# Altium footprint library con-amp.PCBLIB: 295 footprints (part 16 of 19)
Each footprint in its own frame and in the unit in brackets; x right, y up, seen from the top. Pads: shape width x height; smd on the part's side, far side on the other; paste and mask are expansions set on the pad; w line width, h text height; cw(c..) or ccw(c..) is an arc to the next point about the centre after c.
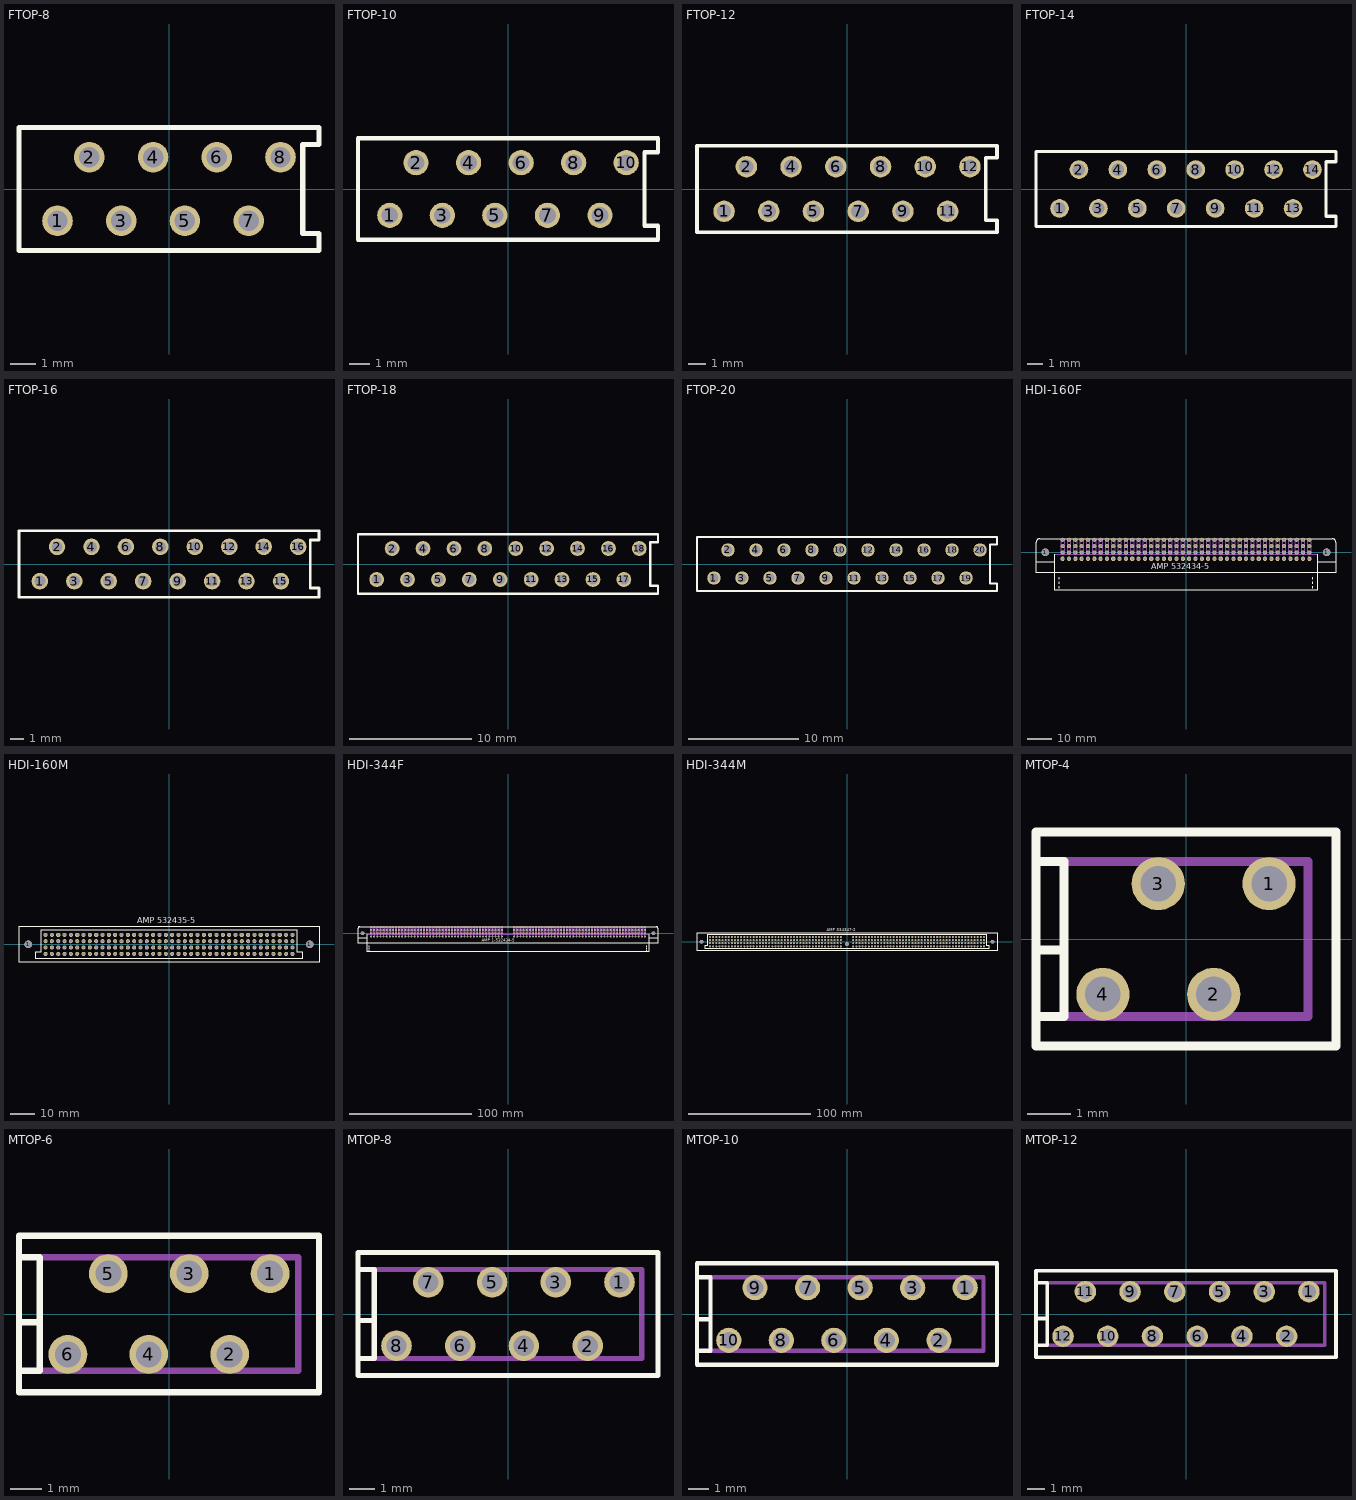
[diagram p15: the footprints below, top view; thin cyan lines are the x and y axes]

## FTOP-8 [mil]
pads (8):
  round 48 hole 32: 1(-175,-50) 2(-125,50) 3(-75,-50) 4(-25,50) 5(25,-50) 6(75,50) 7(125,-50) 8(175,50)
Top Overlay:
  lines w8: -235.43,-96.46 235.43,-96.46 235.43,-70 210,-70 210,70 235.43,70 235.43,96.46 -235.43,96.46 -235.43,-96.46

## FTOP-10 [mil]
pads (10):
  round 48 hole 32: 1(-225,-50) 2(-175,50) 3(-125,-50) 4(-75,50) 5(-25,-50) 6(25,50) 7(75,-50) 8(125,50) 9(175,-50) 10(225,50)
Top Overlay:
  lines w8: -285.43,-96.46 285.43,-96.46 285.43,-70 260,-70 260,70 285.43,70 285.43,96.46 -285.43,96.46 -285.43,-96.46

## FTOP-12 [mil]
pads (12):
  round 48 hole 32: 1(-275,-50) 2(-225,50) 3(-175,-50) 4(-125,50) 5(-75,-50) 6(-25,50) 7(25,-50) 8(75,50) 9(125,-50) 10(175,50) 11(225,-50) 12(275,50)
Top Overlay:
  lines w8: -335.43,-96.46 335.43,-96.46 335.43,-70 310,-70 310,70 335.43,70 335.43,96.46 -335.43,96.46 -335.43,-96.46

## FTOP-14 [mil]
pads (14):
  round 48 hole 32: 1(-325,-50) 2(-275,50) 3(-225,-50) 4(-175,50) 5(-125,-50) 6(-75,50) 7(-25,-50) 8(25,50) 9(75,-50) 10(125,50) 11(175,-50) 12(225,50) 13(275,-50) 14(325,50)
Top Overlay:
  lines w8: -385.43,-96.46 385.43,-96.46 385.43,-70 360,-70 360,70 385.43,70 385.43,96.46 -385.43,96.46 -385.43,-96.46

## FTOP-16 [mil]
pads (16):
  round 48 hole 32: 1(-375,-50) 2(-325,50) 3(-275,-50) 4(-225,50) 5(-175,-50) 6(-125,50) 7(-75,-50) 8(-25,50) 9(25,-50) 10(75,50) 11(125,-50) 12(175,50) 13(225,-50) 14(275,50) 15(325,-50) 16(375,50)
Top Overlay:
  lines w8: -435.43,-96.46 435.43,-96.46 435.43,-70 410,-70 410,70 435.43,70 435.43,96.46 -435.43,96.46 -435.43,-96.46

## FTOP-18 [mil]
pads (18):
  round 48 hole 32: 1(-425,-50) 2(-375,50) 3(-325,-50) 4(-275,50) 5(-225,-50) 6(-175,50) 7(-125,-50) 8(-75,50) 9(-25,-50) 10(25,50) 11(75,-50) 12(125,50) 13(175,-50) 14(225,50) 15(275,-50) 16(325,50) 17(375,-50) 18(425,50)
Top Overlay:
  lines w8: -485.43,-96.46 485.43,-96.46 485.43,-70 460,-70 460,70 485.43,70 485.43,96.46 -485.43,96.46 -485.43,-96.46

## FTOP-20 [mil]
pads (20):
  round 48 hole 32: 1(-475,-50) 2(-425,50) 3(-375,-50) 4(-325,50) 5(-275,-50) 6(-225,50) 7(-175,-50) 8(-125,50) 9(-75,-50) 10(-25,50) 11(25,-50) 12(75,50) 13(125,-50) 14(175,50) 15(225,-50) 16(275,50) 17(325,-50) 18(375,50) 19(425,-50) 20(475,50)
Top Overlay:
  lines w8: -535.43,-96.46 535.43,-96.46 535.43,-70 510,-70 510,70 535.43,70 535.43,96.46 -535.43,96.46 -535.43,-96.46

## HDI-160F [mil]
pads (162):
  round 120.08 hole 120.08: 1(-2224.8,0) 1(2224.8,0)
  oct 64.36x64.36 hole 42.91: A1(1950,-100) A2(1850,-100) A3(1750,-100) A4(1650,-100) A5(1550,-100) A6(1450,-100) A7(1350,-100) A8(1250,-100) A9(1150,-100) A10(1050,-100) A11(950,-100) A12(850,-100) A13(750,-100) A14(650,-100) A15(550,-100) A16(450,-100) A17(350,-100) A18(250,-100) A19(150,-100) A20(50,-100) A21(-50,-100) A22(-150,-100) A23(-250,-100) A24(-350,-100) A25(-450,-100) A26(-550,-100) A27(-650,-100) A28(-750,-100) A29(-850,-100) A30(-950,-100) A31(-1050,-100) A32(-1150,-100) A33(-1250,-100) A34(-1350,-100) A35(-1450,-100) A36(-1550,-100) A37(-1650,-100) A38(-1750,-100) A39(-1850,-100) A40(-1950,-100)
  round 64.36 hole 42.91: B1(1950,0) B2(1850,0) B3(1750,0) B4(1650,0) B5(1550,0) B6(1450,0) B7(1350,0) B8(1250,0) B9(1150,0) B10(1050,0) B11(950,0) B12(850,0) B13(750,0) B14(650,0) B15(550,0) B16(450,0) B17(350,0) B18(250,0) B19(150,0) B20(50,0) B21(-50,0) B22(-150,0) B23(-250,0) B24(-350,0) B25(-450,0) B26(-550,0) B27(-650,0) B28(-750,0) B29(-850,0) B30(-950,0) B31(-1050,0) B32(-1150,0) B33(-1250,0) B34(-1350,0) B35(-1450,0) B36(-1550,0) B37(-1650,0) B38(-1750,0) B39(-1850,0) B40(-1950,0) C1(1950,100) C2(1850,100) C3(1750,100) C4(1650,100) C5(1550,100) C6(1450,100) C7(1350,100) C8(1250,100) C9(1150,100) C10(1050,100) C11(950,100) C12(850,100) C13(750,100) C14(650,100) C15(550,100) C16(450,100) C17(350,100) C18(250,100) C19(150,100) C20(50,100) C21(-50,100) C22(-150,100) C23(-250,100) C24(-350,100) C25(-450,100) C26(-550,100) C27(-650,100) C28(-750,100) C29(-850,100) C30(-950,100) C31(-1050,100) C32(-1150,100) C33(-1250,100) C34(-1350,100) C35(-1450,100) C36(-1550,100) C37(-1650,100) C38(-1750,100) C39(-1850,100) C40(-1950,100) D1(1950,200) D2(1850,200) D3(1750,200) D4(1650,200) D5(1550,200) D6(1450,200) D7(1350,200) D8(1250,200) D9(1150,200) D10(1050,200) D11(950,200) D12(850,200) D13(750,200) D14(650,200) D15(550,200) D16(450,200) D17(350,200) D18(250,200) D19(150,200) D20(50,200) D21(-50,200) D22(-150,200) D23(-250,200) D24(-350,200) D25(-450,200) D26(-550,200) D27(-650,200) D28(-750,200) D29(-850,200) D30(-950,200) D31(-1050,200) D32(-1150,200) D33(-1250,200) D34(-1350,200) D35(-1450,200) D36(-1550,200) D37(-1650,200) D38(-1750,200) D39(-1850,200) D40(-1950,200)
Top Overlay:
  lines w8: -2077.56,-32.83 -2077.56,-153.54 ; -2072.05,-322.83 2072.44,-322.83 ; -2006.69,-566.93 -2006.69,-535.43 ; -2006.69,-496.06 -2006.69,-464.57 ; -2006.69,-425.2 -2006.69,-393.7 ; -1980,210 -1980,215 ; -1980,216.54 -2312.99,216.54 ccw(c-2312.99,157.48) -2372.05,157.48 -2372.05,-153.54 ; -1920,210 -1920,215 ; -1920,216.54 -1880,216.54 ; -1880,210 -1880,215 ; -1820,210 -1820,215 ; -1820,216.54 -1780,216.54 ; -1780,210 -1780,215 ; -1720,210 -1720,215 ; -1720,216.54 -1680,216.54 ; -1680,210 -1680,215 ; -1620,210 -1620,215 ; -1620,216.54 -1580,216.54 ; -1580,210 -1580,215 ; -1520,210 -1520,215 ; -1520,216.54 -1480,216.54 ; -1480,210 -1480,215 ; -1420,210 -1420,215 ; -1420,216.54 -1380,216.54 ; -1380,210 -1380,215 ; -1320,210 -1320,215 ; -1320,216.54 -1280,216.54 ; -1280,210 -1280,215 ; -1220,210 -1220,215 ; -1220,216.54 -1180,216.54 ; -1180,210 -1180,215 ; -1120,210 -1120,215 ; -1120,216.54 -1080,216.54 ; -1080,210 -1080,215 ; -1020,210 -1020,215 ; -1020,216.54 -980,216.54 ; -980,210 -980,215 ; -920,210 -920,215 ; -920,216.54 -880,216.54 ; -880,210 -880,215 ; -820,210 -820,215 ; -820,216.54 -780,216.54 ; -780,210 -780,215 ; -720,210 -720,215 ; -720,216.54 -680,216.54 ; -680,210 -680,215 ; -620,210 -620,215 ; -620,216.54 -580,216.54 ; -580,210 -580,215 ; -520,210 -520,215 ; -520,216.54 -480,216.54 ; -480,210 -480,215 ; -420,210 -420,215 ; -420,216.54 -380,216.54 ; -380,210 -380,215 ; -320,210 -320,215 ; -320,216.54 -280,216.54 ; -280,210 -280,215 ; -220,210 -220,215 ; -220,216.54 -180,216.54 ; -180,210 -180,215 ; -120,210 -120,215 ; -120,216.54 -80,216.54 ; -80,210 -80,215 ; -20,210 -20,215 ; -20,216.54 20,216.54 ; 20,210 20,215 ; 80,210 80,215 ; 80,216.54 120,216.54 ; 120,210 120,215 ; 180,210 180,215 ; 180,216.54 220,216.54 ; 220,210 220,215 ; 280,210 280,215 ; 280,216.54 320,216.54 ; 320,210 320,215 ; 380,210 380,215 ; 380,216.54 420,216.54 ; 420,210 420,215 ; 480,210 480,215 ; 480,216.54 520,216.54 ; 520,210 520,215 ; 580,210 580,215 ; 580,216.54 620,216.54 ; 620,210 620,215 ; 680,210 680,215 ; 680,216.54 720,216.54 ; 720,210 720,215 ; 780,210 780,215 ; 780,216.54 820,216.54 ; 820,210 820,215 ; 880,210 880,215 ; 880,216.54 920,216.54 ; 920,210 920,215 ; 980,210 980,215 ; 980,216.54 1020,216.54 ; 1020,210 1020,215 ; 1080,210 1080,215 ; 1080,216.54 1120,216.54 ; 1120,210 1120,215 ; 1180,210 1180,215 ; 1180,216.54 1220,216.54 ; 1220,210 1220,215 ; 1280,210 1280,215 ; 1280,216.54 1320,216.54 ; 1320,210 1320,215 ; 1380,210 1380,215 ; 1380,216.54 1420,216.54 ; 1420,210 1420,215 ; 1480,210 1480,215 ; 1480,216.54 1520,216.54 ; 1520,210 1520,215 ; 1580,210 1580,215 ; 1580,216.54 1620,216.54 ; 1620,210 1620,215 ; 1680,210 1680,215 ; 1680,216.54 1720,216.54 ; 1720,210 1720,215 ; 1780,210 1780,215 ; 1780,216.54 1820,216.54 ; 1820,210 1820,215 ; 1880,210 1880,215 ; 1880,216.54 1920,216.54 ; 1920,210 1920,215 ; 1980,210 1980,215 ; 1980,216.54 2312.99,216.54 cw(c2312.99,157.48) 2372.05,157.48 2372.05,-153.54 ; 2007.87,-566.93 2007.87,-535.43 ; 2007.87,-496.06 2007.87,-464.57 ; 2007.87,-425.2 2007.87,-393.7 ; 2078.74,-32.84 2078.74,-153.54 ; -2372.05,-153.54 -2372.05,-322.83 -2077.56,-322.83 ; -2372.05,-153.54 -2077.56,-153.54 ; -2077.56,-322.83 -2077.56,-598.43 2078.74,-598.43 2078.74,-322.84 ; -2077.56,-322.83 -2077.56,-153.54 ; 2078.74,-322.84 2372.05,-322.83 2372.05,-153.54 ; 2078.74,-322.84 2078.74,-153.54 ; 2078.74,-153.54 2372.05,-153.54
  text "AMP 532434-5" at -550,-300 h155
Mechanical 16:
  lines w8: -2075,-30 2075,-30 ; -1980,-30 -1980,210 -1920,210 -1920,-30 ; -1880,-30 -1880,210 -1820,210 -1820,-30 ; -1780,-30 -1780,210 -1720,210 -1720,-30 ; -1680,-30 -1680,210 -1620,210 -1620,-30 ; -1580,-30 -1580,210 -1520,210 -1520,-30 ; -1480,-30 -1480,210 -1420,210 -1420,-30 ; -1380,-30 -1380,210 -1320,210 -1320,-30 ; -1280,-30 -1280,210 -1220,210 -1220,-30 ; -1180,-30 -1180,210 -1120,210 -1120,-30 ; -1080,-30 -1080,210 -1020,210 -1020,-30 ; -980,-30 -980,210 -920,210 -920,-30 ; -880,-30 -880,210 -820,210 -820,-30 ; -780,-30 -780,210 -720,210 -720,-30 ; -680,-30 -680,210 -620,210 -620,-30 ; -580,-30 -580,210 -520,210 -520,-30 ; -480,-30 -480,210 -420,210 -420,-30 ; -380,-30 -380,210 -320,210 -320,-30 ; -280,-30 -280,210 -220,210 -220,-30 ; -180,-30 -180,210 -120,210 -120,-30 ; -80,-30 -80,210 -20,210 -20,-30 ; 20,-30 20,210 80,210 80,-30 ; 120,-30 120,210 180,210 180,-30 ; 220,-30 220,210 280,210 280,-30 ; 320,-30 320,210 380,210 380,-30 ; 420,-30 420,210 480,210 480,-30 ; 520,-30 520,210 580,210 580,-30 ; 620,-30 620,210 680,210 680,-30 ; 720,-30 720,210 780,210 780,-30 ; 820,-30 820,210 880,210 880,-30 ; 920,-30 920,210 980,210 980,-30 ; 1020,-30 1020,210 1080,210 1080,-30 ; 1120,-30 1120,210 1180,210 1180,-30 ; 1220,-30 1220,210 1280,210 1280,-30 ; 1320,-30 1320,210 1380,210 1380,-30 ; 1420,-30 1420,210 1480,210 1480,-30 ; 1520,-30 1520,210 1580,210 1580,-30 ; 1620,-30 1620,210 1680,210 1680,-30 ; 1720,-30 1720,210 1780,210 1780,-30 ; 1820,-30 1820,210 1880,210 1880,-30 ; 1920,-30 1920,210 1980,210 1980,-30

## HDI-160M [mil]
pads (162):
  round 120.08 hole 120.08: 1(-2224.8,0) 1(2224.8,0)
  oct 64.36x64.36 hole 42.91: A1(1950,150) A2(1850,150) A3(1750,150) A4(1650,150) A5(1550,150) A6(1450,150) A7(1350,150) A8(1250,150) A9(1150,150) A10(1050,150) A11(950,150) A12(850,150) A13(750,150) A14(650,150) A15(550,150) A16(450,150) A17(350,150) A18(250,150) A19(150,150) A20(50,150) A21(-50,150) A22(-150,150) A23(-250,150) A24(-350,150) A25(-450,150) A26(-550,150) A27(-650,150) A28(-750,150) A29(-850,150) A30(-950,150) A31(-1050,150) A32(-1150,150) A33(-1250,150) A34(-1350,150) A35(-1450,150) A36(-1550,150) A37(-1650,150) A38(-1750,150) A39(-1850,150) A40(-1950,150)
  round 64.36 hole 42.91: B1(1950,50) B2(1850,50) B3(1750,50) B4(1650,50) B5(1550,50) B6(1450,50) B7(1350,50) B8(1250,50) B9(1150,50) B10(1050,50) B11(950,50) B12(850,50) B13(750,50) B14(650,50) B15(550,50) B16(450,50) B17(350,50) B18(250,50) B19(150,50) B20(50,50) B21(-50,50) B22(-150,50) B23(-250,50) B24(-350,50) B25(-450,50) B26(-550,50) B27(-650,50) B28(-750,50) B29(-850,50) B30(-950,50) B31(-1050,50) B32(-1150,50) B33(-1250,50) B34(-1350,50) B35(-1450,50) B36(-1550,50) B37(-1650,50) B38(-1750,50) B39(-1850,50) B40(-1950,50) C1(1950,-50) C2(1850,-50) C3(1750,-50) C4(1650,-50) C5(1550,-50) C6(1450,-50) C7(1350,-50) C8(1250,-50) C9(1150,-50) C10(1050,-50) C11(950,-50) C12(850,-50) C13(750,-50) C14(650,-50) C15(550,-50) C16(450,-50) C17(350,-50) C18(250,-50) C19(150,-50) C20(50,-50) C21(-50,-50) C22(-150,-50) C23(-250,-50) C24(-350,-50) C25(-450,-50) C26(-550,-50) C27(-650,-50) C28(-750,-50) C29(-850,-50) C30(-950,-50) C31(-1050,-50) C32(-1150,-50) C33(-1250,-50) C34(-1350,-50) C35(-1450,-50) C36(-1550,-50) C37(-1650,-50) C38(-1750,-50) C39(-1850,-50) C40(-1950,-50) D1(1950,-150) D2(1850,-150) D3(1750,-150) D4(1650,-150) D5(1550,-150) D6(1450,-150) D7(1350,-150) D8(1250,-150) D9(1150,-150) D10(1050,-150) D11(950,-150) D12(850,-150) D13(750,-150) D14(650,-150) D15(550,-150) D16(450,-150) D17(350,-150) D18(250,-150) D19(150,-150) D20(50,-150) D21(-50,-150) D22(-150,-150) D23(-250,-150) D24(-350,-150) D25(-450,-150) D26(-550,-150) D27(-650,-150) D28(-750,-150) D29(-850,-150) D30(-950,-150) D31(-1050,-150) D32(-1150,-150) D33(-1250,-150) D34(-1350,-150) D35(-1450,-150) D36(-1550,-150) D37(-1650,-150) D38(-1750,-150) D39(-1850,-150) D40(-1950,-150)
Top Overlay:
  lines w8: -2370,-285 2370,-285 2370,285 -2370,285 -2370,-285 ; -2105,-230 -2105,-120 -2020,-120 -2020,230 2020,230 2020,-120 2105,-120 2105,-230 -2105,-230
  text "AMP 532435-5" at -500,300 h155

## HDI-344F [mil]
pads (346):
  round 120.08 hole 120.08: 1(-4674.8,0) 1(4674.8,0)
  oct 64.36x64.36 hole 42.91: A1(4400,-100) A2(4300,-100) A3(4200,-100) A4(4100,-100) A5(4000,-100) A6(3900,-100) A7(3800,-100) A8(3700,-100) A9(3600,-100) A10(3500,-100) A11(3400,-100) A12(3300,-100) A13(3200,-100) A14(3100,-100) A15(3000,-100) A16(2900,-100) A17(2800,-100) A18(2700,-100) A19(2600,-100) A20(2500,-100) A21(2400,-100) A22(2300,-100) A23(2200,-100) A24(2100,-100) A25(2000,-100) A26(1900,-100) A27(1800,-100) A28(1700,-100) A29(1600,-100) A30(1500,-100) A31(1400,-100) A32(1300,-100) A33(1200,-100) A34(1100,-100) A35(1000,-100) A36(900,-100) A37(800,-100) A38(700,-100) A39(600,-100) A40(500,-100) A41(400,-100) A42(300,-100) A43(200,-100) A44(-200,-100) A45(-300,-100) A46(-400,-100) A47(-500,-100) A48(-600,-100) A49(-700,-100) A50(-800,-100) A51(-900,-100) A52(-1000,-100) A53(-1100,-100) A54(-1200,-100) A55(-1300,-100) A56(-1400,-100) A57(-1500,-100) A58(-1600,-100) A59(-1700,-100) A60(-1800,-100) A61(-1900,-100) A62(-2000,-100) A63(-2100,-100) A64(-2200,-100) A65(-2300,-100) A66(-2400,-100) A67(-2500,-100) A68(-2600,-100) A69(-2700,-100) A70(-2800,-100) A71(-2900,-100) A72(-3000,-100) A73(-3100,-100) A74(-3200,-100) A75(-3300,-100) A76(-3400,-100) A77(-3500,-100) A78(-3600,-100) A79(-3700,-100) A80(-3800,-100) A81(-3900,-100) A82(-4000,-100) A83(-4100,-100) A84(-4200,-100) A85(-4300,-100) A86(-4400,-100)
  round 64.36 hole 42.91: B1(4400,0) B2(4300,0) B3(4200,0) B4(4100,0) B5(4000,0) B6(3900,0) B7(3800,0) B8(3700,0) B9(3600,0) B10(3500,0) B11(3400,0) B12(3300,0) B13(3200,0) B14(3100,0) B15(3000,0) B16(2900,0) B17(2800,0) B18(2700,0) B19(2600,0) B20(2500,0) B21(2400,0) B22(2300,0) B23(2200,0) B24(2100,0) B25(2000,0) B26(1900,0) B27(1800,0) B28(1700,0) B29(1600,0) B30(1500,0) B31(1400,0) B32(1300,0) B33(1200,0) B34(1100,0) B35(1000,0) B36(900,0) B37(800,0) B38(700,0) B39(600,0) B40(500,0) B41(400,0) B42(300,0) B43(200,0) B44(-200,0) B45(-300,0) B46(-400,0) B47(-500,0) B48(-600,0) B49(-700,0) B50(-800,0) B51(-900,0) B52(-1000,0) B53(-1100,0) B54(-1200,0) B55(-1300,0) B56(-1400,0) B57(-1500,0) B58(-1600,0) B59(-1700,0) B60(-1800,0) B61(-1900,0) B62(-2000,0) B63(-2100,0) B64(-2200,0) B65(-2300,0) B66(-2400,0) B67(-2500,0) B68(-2600,0) B69(-2700,0) B70(-2800,0) B71(-2900,0) B72(-3000,0) B73(-3100,0) B74(-3200,0) B75(-3300,0) B76(-3400,0) B77(-3500,0) B78(-3600,0) B79(-3700,0) B80(-3800,0) B81(-3900,0) B82(-4000,0) B83(-4100,0) B84(-4200,0) B85(-4300,0) B86(-4400,0) C1(4400,100) C2(4300,100) C3(4200,100) C4(4100,100) C5(4000,100) C6(3900,100) C7(3800,100) C8(3700,100) C9(3600,100) C10(3500,100) C11(3400,100) C12(3300,100) C13(3200,100) C14(3100,100) C15(3000,100) C16(2900,100) C17(2800,100) C18(2700,100) C19(2600,100) C20(2500,100) C21(2400,100) C22(2300,100) C23(2200,100) C24(2100,100) C25(2000,100) C26(1900,100) C27(1800,100) C28(1700,100) C29(1600,100) C30(1500,100) C31(1400,100) C32(1300,100) C33(1200,100) C34(1100,100) C35(1000,100) C36(900,100) C37(800,100) C38(700,100) C39(600,100) C40(500,100) C41(400,100) C42(300,100) C43(200,100) C44(-200,100) C45(-300,100) C46(-400,100) C47(-500,100) C48(-600,100) C49(-700,100) C50(-800,100) C51(-900,100) C52(-1000,100) C53(-1100,100) C54(-1200,100) C55(-1300,100) C56(-1400,100) C57(-1500,100) C58(-1600,100) C59(-1700,100) C60(-1800,100) C61(-1900,100) C62(-2000,100) C63(-2100,100) C64(-2200,100) C65(-2300,100) C66(-2400,100) C67(-2500,100) C68(-2600,100) C69(-2700,100) C70(-2800,100) C71(-2900,100) C72(-3000,100) C73(-3100,100) C74(-3200,100) C75(-3300,100) C76(-3400,100) C77(-3500,100) C78(-3600,100) C79(-3700,100) C80(-3800,100) C81(-3900,100) C82(-4000,100) C83(-4100,100) C84(-4200,100) C85(-4300,100) C86(-4400,100) D1(4400,200) D2(4300,200) D3(4200,200) D4(4100,200) D5(4000,200) D6(3900,200) D7(3800,200) D8(3700,200) D9(3600,200) D10(3500,200) D11(3400,200) D12(3300,200) D13(3200,200) D14(3100,200) D15(3000,200) D16(2900,200) D17(2800,200) D18(2700,200) D19(2600,200) D20(2500,200) D21(2400,200) D22(2300,200) D23(2200,200) D24(2100,200) D25(2000,200) D26(1900,200) D27(1800,200) D28(1700,200) D29(1600,200) D30(1500,200) D31(1400,200) D32(1300,200) D33(1200,200) D34(1100,200) D35(1000,200) D36(900,200) D37(800,200) D38(700,200) D39(600,200) D40(500,200) D41(400,200) D42(300,200) D43(200,200) D44(-200,200) D45(-300,200) D46(-400,200) D47(-500,200) D48(-600,200) D49(-700,200) D50(-800,200) D51(-900,200) D52(-1000,200) D53(-1100,200) D54(-1200,200) D55(-1300,200) D56(-1400,200) D57(-1500,200) D58(-1600,200) D59(-1700,200) D60(-1800,200) D61(-1900,200) D62(-2000,200) D63(-2100,200) D64(-2200,200) D65(-2300,200) D66(-2400,200) D67(-2500,200) D68(-2600,200) D69(-2700,200) D70(-2800,200) D71(-2900,200) D72(-3000,200) D73(-3100,200) D74(-3200,200) D75(-3300,200) D76(-3400,200) D77(-3500,200) D78(-3600,200) D79(-3700,200) D80(-3800,200) D81(-3900,200) D82(-4000,200) D83(-4100,200) D84(-4200,200) D85(-4300,200) D86(-4400,200)
Top Overlay:
  drawing of 285 lines, arcs and shapes, not listed
  text "AMP 1-532434-5" at -850,-300 h155
Mechanical 16:
  drawing of 261 lines, arcs and shapes, not listed

## HDI-344M [mil]
pads (347):
  round 120.08 hole 120.08: 1(-4674.8,0) 1(0,-79.92) 1(4674.8,0)
  oct 64.36x64.36 hole 42.91: A1(4400,150) A2(4300,150) A3(4200,150) A4(4100,150) A5(4000,150) A6(3900,150) A7(3800,150) A8(3700,150) A9(3600,150) A10(3500,150) A11(3400,150) A12(3300,150) A13(3200,150) A14(3100,150) A15(3000,150) A16(2900,150) A17(2800,150) A18(2700,150) A19(2600,150) A20(2500,150) A21(2400,150) A22(2300,150) A23(2200,150) A24(2100,150) A25(2000,150) A26(1900,150) A27(1800,150) A28(1700,150) A29(1600,150) A30(1500,150) A31(1400,150) A32(1300,150) A33(1200,150) A34(1100,150) A35(1000,150) A36(900,150) A37(800,150) A38(700,150) A39(600,150) A40(500,150) A41(400,150) A42(300,150) A43(200,150) A44(-200,150) A45(-300,150) A46(-400,150) A47(-500,150) A48(-600,150) A49(-700,150) A50(-800,150) A51(-900,150) A52(-1000,150) A53(-1100,150) A54(-1200,150) A55(-1300,150) A56(-1400,150) A57(-1500,150) A58(-1600,150) A59(-1700,150) A60(-1800,150) A61(-1900,150) A62(-2000,150) A63(-2100,150) A64(-2200,150) A65(-2300,150) A66(-2400,150) A67(-2500,150) A68(-2600,150) A69(-2700,150) A70(-2800,150) A71(-2900,150) A72(-3000,150) A73(-3100,150) A74(-3200,150) A75(-3300,150) A76(-3400,150) A77(-3500,150) A78(-3600,150) A79(-3700,150) A80(-3800,150) A81(-3900,150) A82(-4000,150) A83(-4100,150) A84(-4200,150) A85(-4300,150) A86(-4400,150)
  round 64.36 hole 42.91: B1(4400,50) B2(4300,50) B3(4200,50) B4(4100,50) B5(4000,50) B6(3900,50) B7(3800,50) B8(3700,50) B9(3600,50) B10(3500,50) B11(3400,50) B12(3300,50) B13(3200,50) B14(3100,50) B15(3000,50) B16(2900,50) B17(2800,50) B18(2700,50) B19(2600,50) B20(2500,50) B21(2400,50) B22(2300,50) B23(2200,50) B24(2100,50) B25(2000,50) B26(1900,50) B27(1800,50) B28(1700,50) B29(1600,50) B30(1500,50) B31(1400,50) B32(1300,50) B33(1200,50) B34(1100,50) B35(1000,50) B36(900,50) B37(800,50) B38(700,50) B39(600,50) B40(500,50) B41(400,50) B42(300,50) B43(200,50) B44(-200,50) B45(-300,50) B46(-400,50) B47(-500,50) B48(-600,50) B49(-700,50) B50(-800,50) B51(-900,50) B52(-1000,50) B53(-1100,50) B54(-1200,50) B55(-1300,50) B56(-1400,50) B57(-1500,50) B58(-1600,50) B59(-1700,50) B60(-1800,50) B61(-1900,50) B62(-2000,50) B63(-2100,50) B64(-2200,50) B65(-2300,50) B66(-2400,50) B67(-2500,50) B68(-2600,50) B69(-2700,50) B70(-2800,50) B71(-2900,50) B72(-3000,50) B73(-3100,50) B74(-3200,50) B75(-3300,50) B76(-3400,50) B77(-3500,50) B78(-3600,50) B79(-3700,50) B80(-3800,50) B81(-3900,50) B82(-4000,50) B83(-4100,50) B84(-4200,50) B85(-4300,50) B86(-4400,50) C1(4400,-50) C2(4300,-50) C3(4200,-50) C4(4100,-50) C5(4000,-50) C6(3900,-50) C7(3800,-50) C8(3700,-50) C9(3600,-50) C10(3500,-50) C11(3400,-50) C12(3300,-50) C13(3200,-50) C14(3100,-50) C15(3000,-50) C16(2900,-50) C17(2800,-50) C18(2700,-50) C19(2600,-50) C20(2500,-50) C21(2400,-50) C22(2300,-50) C23(2200,-50) C24(2100,-50) C25(2000,-50) C26(1900,-50) C27(1800,-50) C28(1700,-50) C29(1600,-50) C30(1500,-50) C31(1400,-50) C32(1300,-50) C33(1200,-50) C34(1100,-50) C35(1000,-50) C36(900,-50) C37(800,-50) C38(700,-50) C39(600,-50) C40(500,-50) C41(400,-50) C42(300,-50) C43(200,-50) C44(-200,-50) C45(-300,-50) C46(-400,-50) C47(-500,-50) C48(-600,-50) C49(-700,-50) C50(-800,-50) C51(-900,-50) C52(-1000,-50) C53(-1100,-50) C54(-1200,-50) C55(-1300,-50) C56(-1400,-50) C57(-1500,-50) C58(-1600,-50) C59(-1700,-50) C60(-1800,-50) C61(-1900,-50) C62(-2000,-50) C63(-2100,-50) C64(-2200,-50) C65(-2300,-50) C66(-2400,-50) C67(-2500,-50) C68(-2600,-50) C69(-2700,-50) C70(-2800,-50) C71(-2900,-50) C72(-3000,-50) C73(-3100,-50) C74(-3200,-50) C75(-3300,-50) C76(-3400,-50) C77(-3500,-50) C78(-3600,-50) C79(-3700,-50) C80(-3800,-50) C81(-3900,-50) C82(-4000,-50) C83(-4100,-50) C84(-4200,-50) C85(-4300,-50) C86(-4400,-50) D1(4400,-150) D2(4300,-150) D3(4200,-150) D4(4100,-150) D5(4000,-150) D6(3900,-150) D7(3800,-150) D8(3700,-150) D9(3600,-150) D10(3500,-150) D11(3400,-150) D12(3300,-150) D13(3200,-150) D14(3100,-150) D15(3000,-150) D16(2900,-150) D17(2800,-150) D18(2700,-150) D19(2600,-150) D20(2500,-150) D21(2400,-150) D22(2300,-150) D23(2200,-150) D24(2100,-150) D25(2000,-150) D26(1900,-150) D27(1800,-150) D28(1700,-150) D29(1600,-150) D30(1500,-150) D31(1400,-150) D32(1300,-150) D33(1200,-150) D34(1100,-150) D35(1000,-150) D36(900,-150) D37(800,-150) D38(700,-150) D39(600,-150) D40(500,-150) D41(400,-150) D42(300,-150) D43(200,-150) D44(-200,-150) D45(-300,-150) D46(-400,-150) D47(-500,-150) D48(-600,-150) D49(-700,-150) D50(-800,-150) D51(-900,-150) D52(-1000,-150) D53(-1100,-150) D54(-1200,-150) D55(-1300,-150) D56(-1400,-150) D57(-1500,-150) D58(-1600,-150) D59(-1700,-150) D60(-1800,-150) D61(-1900,-150) D62(-2000,-150) D63(-2100,-150) D64(-2200,-150) D65(-2300,-150) D66(-2400,-150) D67(-2500,-150) D68(-2600,-150) D69(-2700,-150) D70(-2800,-150) D71(-2900,-150) D72(-3000,-150) D73(-3100,-150) D74(-3200,-150) D75(-3300,-150) D76(-3400,-150) D77(-3500,-150) D78(-3600,-150) D79(-3700,-150) D80(-3800,-150) D81(-3900,-150) D82(-4000,-150) D83(-4100,-150) D84(-4200,-150) D85(-4300,-150) D86(-4400,-150)
Top Overlay:
  lines w8: -4820,-285 4820,-285 4820,285 -4820,285 -4820,-285 ; -4555,-230 -4555,-120 -4470,-120 -4470,230 4470,230 4470,-120 4555,-120 4555,-230 -4555,-230
  text "AMP 534347-2" at -650,300 h155

## MTOP-4 [mil]
pads (4):
  round 48 hole 32: 1(75,50) 2(25,-50) 3(-25,50) 4(-75,-50)
Top Overlay:
  lines w8: -135,-10 -110,-10 ; -135,70 -110,70 -110,-10 ; -135.43,-70 -135.43,96.46 135.43,96.46 135.43,-96.46 -135.43,-96.46 -135.43,-70 ; -135.43,-70 -110,-70 -110,-10
Mechanical 16:
  lines w8: -110,-70 110,-70 110,70 -110,70

## MTOP-6 [mil]
pads (6):
  round 48 hole 32: 1(125,50) 2(75,-50) 3(25,50) 4(-25,-50) 5(-75,50) 6(-125,-50)
Top Overlay:
  lines w8: -185,-10 -160,-10 ; -185,70 -160,70 -160,-10 ; -185.43,-70 -185.43,96.46 185.43,96.46 185.43,-96.46 -185.43,-96.46 -185.43,-70 ; -185.43,-70 -160,-70 -160,-10
Mechanical 16:
  lines w8: -160,-70 160,-70 160,70 -160,70

## MTOP-8 [mil]
pads (8):
  round 48 hole 32: 1(175,50) 2(125,-50) 3(75,50) 4(25,-50) 5(-25,50) 6(-75,-50) 7(-125,50) 8(-175,-50)
Top Overlay:
  lines w8: -235,-10 -210,-10 ; -235,70 -210,70 -210,-10 ; -235.43,-70 -235.43,96.46 235.43,96.46 235.43,-96.46 -235.43,-96.46 -235.43,-70 ; -235.43,-70 -210,-70 -210,-10
Mechanical 16:
  lines w8: -210,-70 210,-70 210,70 -210,70

## MTOP-10 [mil]
pads (10):
  round 48 hole 32: 1(225,50) 2(175,-50) 3(125,50) 4(75,-50) 5(25,50) 6(-25,-50) 7(-75,50) 8(-125,-50) 9(-175,50) 10(-225,-50)
Top Overlay:
  lines w8: -285,-10 -260,-10 ; -285,70 -260,70 -260,-10 ; -285.43,-70 -285.43,96.46 285.43,96.46 285.43,-96.46 -285.43,-96.46 -285.43,-70 ; -285.43,-70 -260,-70 -260,-10
Mechanical 16:
  lines w8: -260,-70 260,-70 260,70 -260,70

## MTOP-12 [mil]
pads (12):
  round 48 hole 32: 1(275,50) 2(225,-50) 3(175,50) 4(125,-50) 5(75,50) 6(25,-50) 7(-25,50) 8(-75,-50) 9(-125,50) 10(-175,-50) 11(-225,50) 12(-275,-50)
Top Overlay:
  lines w8: -335,-10 -310,-10 ; -335,70 -310,70 -310,-10 ; -335.43,-70 -335.43,96.46 335.43,96.46 335.43,-96.46 -335.43,-96.46 -335.43,-70 ; -335.43,-70 -310,-70 -310,-10
Mechanical 16:
  lines w8: -310,-70 310,-70 310,70 -310,70